# Altium footprint library Resistors.PcbLib: 93 footprints (part 6 of 6)
Each footprint in its own frame and in the unit in brackets; x right, y up, seen from the top. Pads: shape width x height; smd on the part's side, far side on the other; paste and mask are expansions set on the pad; w line width, h text height; cw(c..) or ccw(c..) is an arc to the next point about the centre after c.
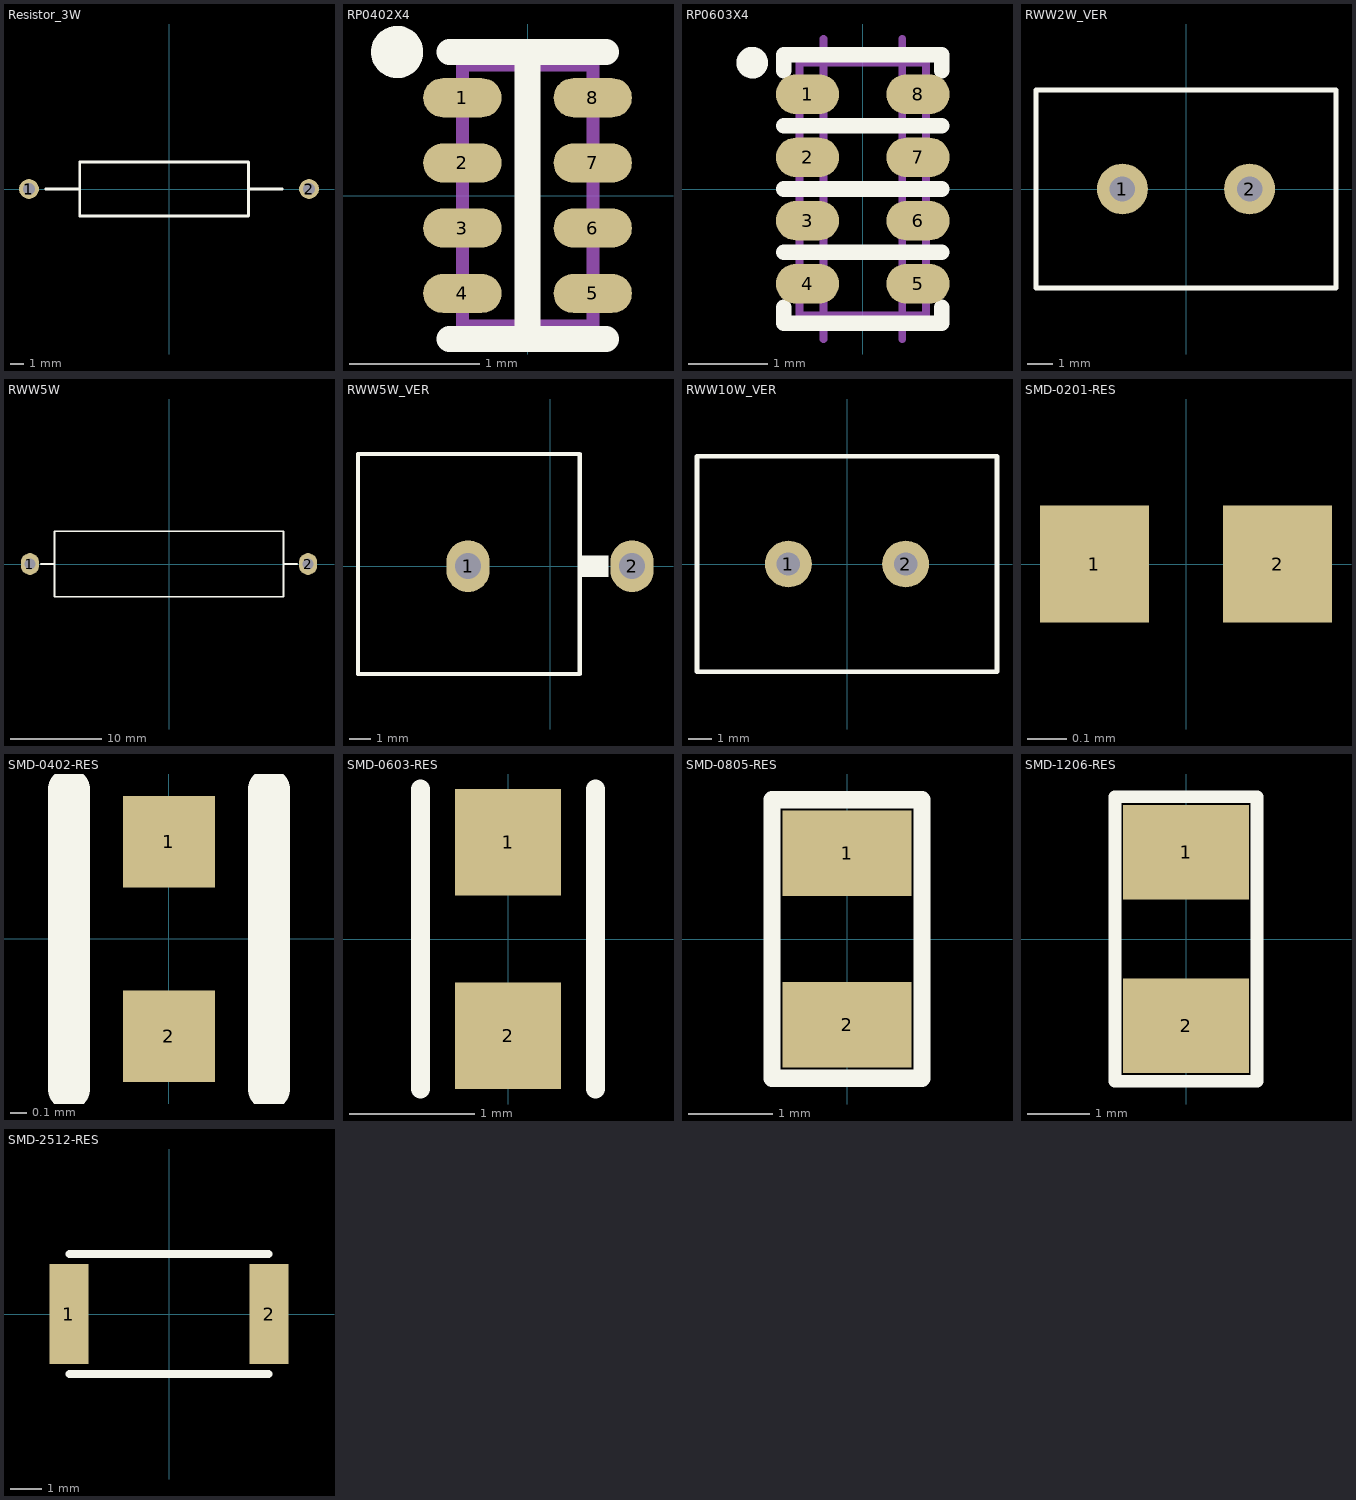
[diagram p5: the footprints below, top view; thin cyan lines are the x and y axes]

## Resistor_3W [mm]
pads (2):
  round 1.5 hole 0.9: 1(-10.53,0) 2(10.53,0)
Top Overlay:
  lines w0.2: -9.26,0 -6.72,0 ; 5.98,0 8.52,0 ; -6.72,-2.032 5.98,-2.032 5.98,2.032 -6.72,2.032 -6.72,-2.032
3D body "Resistor_3W.STEP": height 7.29, standoff -3, extent -11.13,-3.3 11.07,3.3

## RP0402X4 [mm] "RPACK, 0804, 0402X4, 100X50X4, 2.00x1.00mm"
height 0.4
pads (8):
  oval 0.6x0.3 smd mask+0.1: 1(-0.5,0.75) 2(-0.5,0.25) 3(-0.5,-0.25) 4(-0.5,-0.75) 5(0.5,-0.75) 6(0.5,-0.25) 7(0.5,0.25) 8(0.5,0.75)
Top Overlay:
  circle w0.2: c-1,1.1 r0.1
  lines w0.2: -0.6,-1.1 0.6,-1.1 ; -0.6,1.1 0.6,1.1 ; 0,-1.1 0,1.1
Mechanical 13:
  lines w0.1: -0.5,-1 -0.5,1 0.5,1 0.5,-1 -0.5,-1
3D body: height 0.4, standoff 0, extent -0.5,-1 0.5,1

## RP0603X4 [mm] "RPACK, 0603X4, 160X80X4 1206"
height 0.4
pads (8):
  oval 0.8x0.5 smd: 1(-0.7,1.2) 2(-0.7,0.4) 3(-0.7,-0.4) 4(-0.7,-1.2) 5(0.7,-1.2) 6(0.7,-0.4) 7(0.7,0.4) 8(0.7,1.2)
Top Overlay:
  circle w0.2: c-1.4,1.6 r0.1
  lines w0.2: -1,-1.5 -1,-1.7 1,-1.7 1,-1.5 ; -1,-0.8 1,-0.8 ; -1,0 1,0 ; -1,0.8 1,0.8 ; -1,1.5 -1,1.7 1,1.7 1,1.5
Mechanical 13:
  lines w0.1: -0.5,-1.9 -0.5,1.9 ; 0.5,-1.9 0.5,1.9 ; -0.8,-1.6 -0.8,1.6 0.8,1.6 0.8,-1.6 -0.8,-1.6
3D body "User Library-Array-1206-4Way-Var1.STEP": height 0.5, standoff 0, extent -0.8,-1.6 0.8,1.6

## RWW2W_VER [mm] "RESISTOR 2 WATT, Wirewound"
pads (2):
  round 2 hole 1: 1(-2.5,0) 2(2.5,0)
Top Overlay:
  lines w0.2: -5.9,-3.9 -5.9,3.9 5.9,3.9 5.9,-3.9 -5.9,-3.9
3D body "User Library-Cement Power Resistor SQM-02 2W 4R3.step": height 20.5, standoff -5, extent -5.75,-3.75 5.75,3.75

## RWW5W [mm] "RESISTOR 5 WATT, Wirewound"
height 4.064
pads (2):
  oval 2x2.4 hole 1.2: 1(-15.3,0) 2(15.3,0)
Top Overlay:
  lines w0.2: -14.1,0 -12.6,0 ; 12.6,0 14.1,0 ; -12.6,-3.6 12.6,-3.6 12.6,3.6 -12.6,3.6 -12.6,-3.6
3D body "RES 5W.STEP": height 8.35, standoff -2.85, extent -15.645,-3.5 15.635,3.5

## RWW5W_VER [mm] "RESISTOR 5 WATT, Wirewound"
pads (2):
  oval 2x2.4 hole 1.2: 1(-3.8,0) 2(3.8,0)
Top Overlay:
  rectangle: 1.4,-0.5 2.7,0.5
  lines w0.2: -8.9,-5 -8.9,5.2 1.37,5.2 1.37,-5 -8.9,-5
3D body "5W Res.STEP": height 23.05, standoff -2.4, extent -8.765,-4.928 4.315,5.072

## RWW10W_VER [mm] "RESISTOR 10 WATT, Wirewound"
pads (2):
  round 2 hole 1: 1(-2.5,0) 2(2.5,0)
Top Overlay:
  lines w0.2: -6.4,-4.6 -6.4,4.6 6.4,4.6 6.4,-4.6 -6.4,-4.6
3D body "User Library-Cement Power Resistor SQM-10 10W R10.step": height 51, standoff -5, extent -6.25,-4.5 6.25,4.5

## SMD-0201-RES [mm] "SMD-0201-RES"
height 0.25
pads (2):
  rect 0.28x0.3 smd: 1(-0.235,0) 2(0.235,0)
3D body "User Library-0201(0603M) Res.step": height 0.3, standoff -0.01, extent -0.305,-0.152 0.305,0.155

## SMD-0402-RES [mm]
pads (2):
  rect 0.55x0.55 smd: 1(0,0.584) 2(0,-0.584)
Top Overlay:
  lines w0.254: -0.6,-0.9 -0.6,0.9 ; 0.6,-0.9 0.6,0.9
3D body "resistor0402.step": height 0.41, standoff 0, extent -0.275,-0.575 0.275,0.575

## SMD-0603-RES [mm]
pads (2):
  rect 0.85x0.85 smd: 1(0,0.775) 2(0,-0.775)
Top Overlay:
  lines w0.152: -0.7,-1.2 -0.7,1.2 ; 0.7,-1.2 0.7,1.2
3D body "0603.step": height 0.56, standoff 0, extent -0.4,-0.85 0.4,0.85

## SMD-0805-RES [mil]
pads (2):
  rect 60x40 smd: 1(0,40) 2(0,-40)
Top Overlay:
  lines w8: -35,-65 35,-65 35,65 -35,65 -35,-65
3D body "SW3dPS-0805 SMD Resistor.STEP": height 30.79, standoff 0, extent -23.6,-39.37 25.61,39.37

## SMD-1206-RES [mil]
pads (2):
  rect 80x60 smd: 1(0,55) 2(0,-55)
Top Overlay:
  lines w8: -45,-90 -45,90 45,90 45,-90 -45,-90
3D body "User Library-RES_3216-1206.step": height 33.46, standoff 0, extent -34.05,-65.94 34.06,65.95

## SMD-2512-RES [mil]
pads (2):
  rect 49x125 smd: 1(-125.5,0) 2(125.5,0)
Top Overlay:
  lines w10: -125,-75 125,-75 ; -125,75 125,75
3D body "resistor 2512.step": height 63.07, standoff 0, extent -125,-59.05 125,59.06